# Altium footprint library LCLP.PcbLib: 75 footprints (part 3 of 5)
Each footprint in its own frame and in the unit in brackets; x right, y up, seen from the top. Pads: shape width x height; smd on the part's side, far side on the other; paste and mask are expansions set on the pad; w line width, h text height; cw(c..) or ccw(c..) is an arc to the next point about the centre after c.
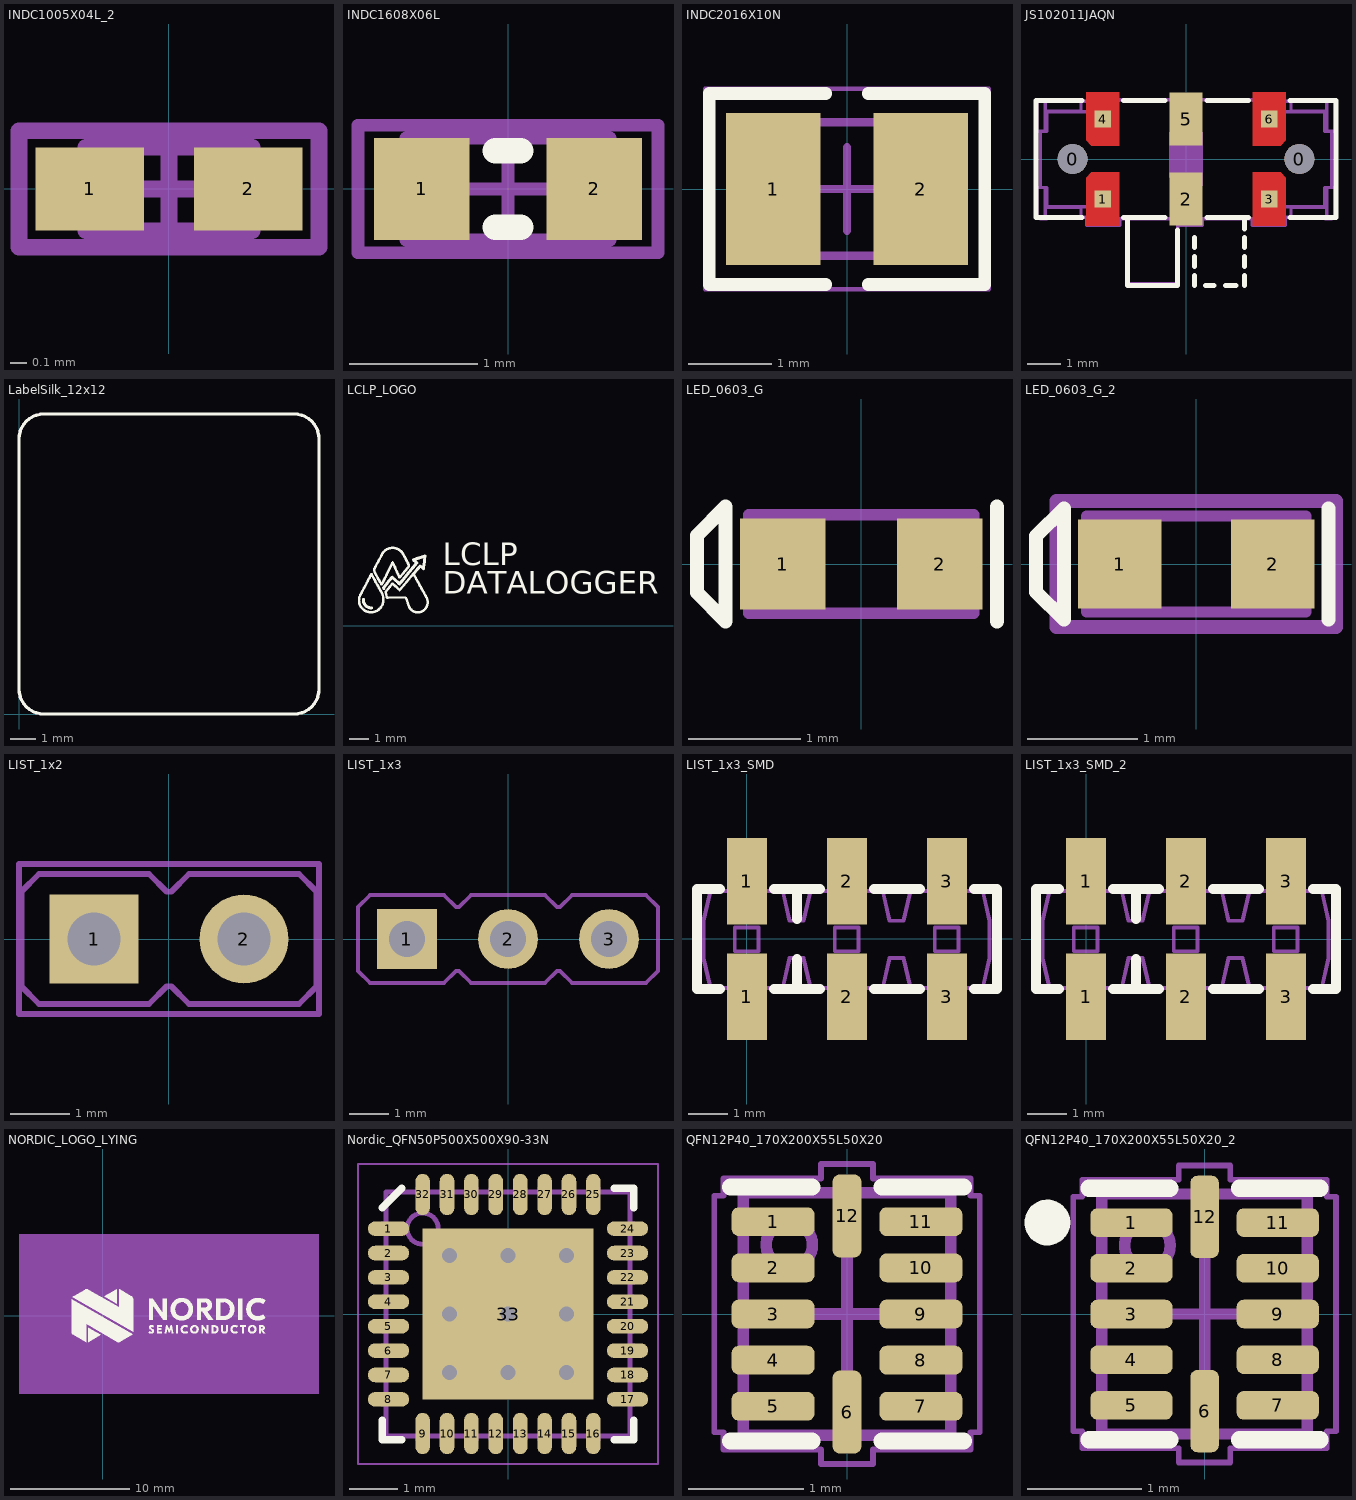
[diagram p2: the footprints below, top view; thin cyan lines are the x and y axes]

## INDC1005X04L_2 [mm]
pads (2):
  rect 0.65x0.5 smd: 1(-0.475,0) 2(0.475,0)
Mechanical 7:
  lines w0.1: -0.5,-0.25 0.5,-0.25 0.5,0.25 -0.5,0.25 -0.5,-0.25
  text ".Designator" at -1.525,-0.102 h0.31
Mechanical 15:
  lines w0.1: -0.275,0 0.275,0 ; 0,-0.275 0,0.275 ; -0.9,-0.35 0.9,-0.35 0.9,0.35 -0.9,0.35 -0.9,-0.35
3D body "INDC1005.step": height 0.5, standoff 0, extent -0.5,-0.25 0.5,0.25

## INDC1608X06L [mm] "Chip Inductor, 2-Leads, Body 1.6x0.8mm, IPC High Density"
height 0.55
pads (2):
  rect 0.75x0.8 smd: 1(-0.675,0) 2(0.675,0)
Top Overlay:
  lines w0.2: -0.1,-0.3 0.1,-0.3 ; -0.1,0.3 0.1,0.3
Mechanical 7:
  lines w0.1: -0.8,-0.4 0.8,-0.4 0.8,0.4 -0.8,0.4 -0.8,-0.4
  text ".Designator" at 1.489,0.102 h0.31
Mechanical 15:
  lines w0.1: -0.45,0 0.45,0 ; 0,-0.45 0,0.45 ; -1.175,-0.5 -1.175,0.5 1.175,0.5 1.175,-0.5 -1.175,-0.5
3D body "INDC1608.step": height 0.8, standoff 0, extent -0.8,-0.4 0.8,0.4

## INDC2016X10N [mm] "Chip Inductor, 2-Leads, Body 2.00x1.60mm, IPC Medium Density"
height 1
pads (2):
  rect 1.13x1.82 smd: 1(-0.885,0) 2(0.885,0)
Top Overlay:
  lines w0.15: -0.254,-1.143 -1.651,-1.143 -1.651,1.143 -0.254,1.143 ; 0.254,-1.143 1.651,-1.143 1.651,1.143 0.254,1.143
Mechanical 7:
  lines w0.1: -1,-0.8 1,-0.8 1,0.8 -1,0.8 -1,-0.8
  text ".Designator" at -2.032,-0.381 h0.31
Mechanical 15:
  lines w0.05: -1.7,-1.2 1.7,-1.2 1.7,1.2 -1.7,1.2 -1.7,-1.2
  lines w0.1: -0.5,0 0.5,0 ; 0,-0.5 0,0.5
3D body "INDC2016X10.step": height 1, standoff 0, extent -1,-0.8 1,0.8

## JS102011JAQN [mm] "Slide Switches - DPDT, SMD, ON-ON"
height 3.5
pads (8):
  round 0.9 hole 0.9 unplated mask+0: 0(-3.4,0) 0(3.4,0)
  rect 0.5x0.5 smd: 1(-2.5,-1.2) 3(2.5,-1.2) 4(-2.5,1.2) 6(2.5,1.2)
  rect 1x1.6 smd: 2(0,-1.2) 5(0,1.2)
Top Layer:
  region: 3,-0.562 2.838,-0.4 2,-0.4 2,-2 3,-2
  region: 3,0.562 2.838,0.4 2,0.4 2,2 3,2
  region: -3,-0.562 -2.838,-0.4 -2,-0.4 -2,-2 -3,-2
  region: -3,0.562 -2.838,0.4 -2,0.4 -2,2 -3,2
Top Overlay:
  lines w0.152: -3.126,-1.75 -4.5,-1.75 -4.5,1.75 -3.126,1.75 ; -1.874,-1.75 -0.626,-1.75 ; -1.874,1.75 -0.626,1.75 ; -1.75,-1.75 -1.75,-3.8 -0.25,-3.8 -0.25,-2.126 ; 0.25,-3.8 0.25,-3.5 ; 0.25,-3.22 0.25,-2.92 ; 0.25,-2.66 0.25,-2.36 ; 0.59,-3.8 0.84,-3.8 ; 0.626,-1.75 1.874,-1.75 ; 0.626,1.75 1.874,1.75 ; 1.19,-3.8 1.44,-3.8 ; 1.2,-3.8 1.5,-3.8 ; 1.75,-3.8 1.75,-3.5 ; 1.75,-3.22 1.75,-2.92 ; 1.75,-2.66 1.75,-2.36 ; 1.75,-2.1 1.75,-1.75 ; 3.126,-1.75 4.5,-1.75 4.5,1.75 3.126,1.75
Mechanical 7:
  region: -0.5,-0.554 -0.254,-0.8 0.5,-0.8 0.5,0.8 -0.5,0.8
  lines w0.1: -4.376,-1.747 -4.376,-1.797 -4.174,-1.797 -4.174,-1.747 ; -4.376,1.731 -4.376,1.781 -4.174,1.781 -4.174,1.731 ; -4.224,-1.747 -4.224,-0.853 ; -4.224,-1.449 -3.151,-1.449 -3.151,-1.747 ; -4.224,0.836 -4.224,1.731 ; -4.224,1.433 -3.151,1.433 -3.151,1.731 ; -2.982,-1.747 -2.982,-1.996 -1.988,-1.996 -1.988,-1.797 ; -2.783,-1.747 -2.783,-1.797 -2.772,-1.797 ; -2.783,1.731 -2.783,1.781 -2.772,1.781 ; -2.772,-1.747 -4.472,-1.747 -4.472,-0.853 -4.376,-0.853 ; -2.772,1.731 -4.472,1.731 -4.472,0.836 -4.376,0.836 ; -1.74,-1.797 -1.74,-3.735 -0.249,-3.735 -0.249,-1.797 ; -0.249,-1.996 0.496,-1.996 0.496,-1.797 ; 1.987,-1.797 1.987,-1.996 2.981,-1.996 2.981,-1.747 ; 2.77,-1.747 4.471,-1.747 4.471,-0.853 4.375,-0.853 ; 2.77,1.731 4.471,1.731 4.471,0.836 4.375,0.836 ; 2.782,-1.747 2.782,-1.797 2.77,-1.797 ; 2.782,1.731 2.782,1.781 2.77,1.781 ; 3.149,-1.747 3.149,-1.449 4.223,-1.449 ; 3.149,1.731 3.149,1.433 4.223,1.433 ; 4.173,-1.747 4.173,-1.797 4.375,-1.797 4.375,-1.747 ; 4.173,1.731 4.173,1.781 4.375,1.781 4.375,1.731 ; 4.223,-1.747 4.223,-0.853 ; 4.223,0.836 4.223,1.731 ; -4.376,-0.853 -4.168,-0.853 -4.168,-1.434 -2.772,-1.434 -2.772,-1.797 ; -4.376,-0.853 -4.376,0.836 ; -4.376,0.836 -4.168,0.836 -4.168,1.418 -2.772,1.418 -2.772,1.781 ; -2.772,-1.797 2.77,-1.797 ; -2.772,1.781 2.77,1.781 ; 2.77,-1.797 2.77,-1.434 4.166,-1.434 4.166,-0.853 4.375,-0.853 ; 2.77,1.781 2.77,1.418 4.166,1.418 4.166,0.836 4.375,0.836 ; 4.375,-0.853 4.375,0.836
  text ".Designator" at -1.062,-0.396 h0.31
3D body "CL-SB-22A-11T.stp": height 3.5, standoff 0, extent -4.25,-3.75 4.25,1.75

## LabelSilk_12x12 [mm] "PCA version label, stick-on, 12x12mm"
height 0.05
Top Overlay:
  lines w0.127: 0,1 ccw(c1,1) 1,0 11,0 ccw(c11,1) 12,1 12,11 ccw(c11,11) 11,12 1,12 ccw(c1,11) 0,11 0,1
  text ".Designator" at 2.788,5.687 h1.5
Mechanical 7:
  lines w0.1: 0,1 ccw(c1,1) 1,0 11,0 ccw(c11,1) 12,1 12,11 ccw(c11,11) 11,12 1,12 ccw(c1,11) 0,11 0,1
  text ".Designator" at 4.475,5.898 h0.31
3D body: height 0.05, standoff 0, extent 0,0 12,12

## LCLP_LOGO [mm]
Top Overlay:
  drawing of 5 lines, arcs and shapes, not listed
  text "DATALOGGER" at 7.62,1.285 h2.03
  text "LCLP" at 7.62,2.794 h2.03

## LED_0603_G [mil] "SMD Super Bright LED, GREEN"
height 23.62
pads (2):
  rect 30x32 smd: 1(-27.5,0) 2(27.5,0)
Top Overlay:
  lines w5: 47.5,-20 47.5,20 ; -57.5,-10 -57.5,10 -47.5,20 -47.5,-20 -57.5,-10
Mechanical 7:
  lines w3.94: -27.56,-17.26 -27.56,17.26 ; -23.62,-17.26 -23.62,17.26 ; 23.62,-17.26 23.62,17.26 ; 27.56,-17.26 27.56,17.26 ; -39.37,-17.26 -39.37,17.26 39.37,17.26 39.37,-17.26 -39.37,-17.26
  text ".Designator" at -60.02,-4 h12.01
3D body "User Library-led_0603_green.step": height 23.62, standoff 0, extent -31.63,-15.75 32.15,15.75

## LED_0603_G_2 [mil]
pads (2):
  rect 30x32 smd: 1(-27.5,0) 2(27.5,0)
Top Overlay:
  lines w5: 47.5,-20 47.5,20 ; -57.5,-10 -47.5,-20 -47.5,20 -57.5,10 -57.5,-10
Mechanical 7:
  rectangle: -39.37,-17.72 -22.64,17.26
  lines w3.94: -39.37,-17.26 -39.37,17.26 39.37,17.26 39.37,-17.26 -39.37,-17.26
  text ".Designator" at 67.04,4.18 h12.01
Mechanical 15:
  lines w5: -50.2,-22.64 50.2,-22.64 50.2,22.64 -50.2,22.64 -50.2,-22.64
3D body "User Library-led_0603_green.step": height 23.62, standoff 0, extent -31.63,-15.75 32.15,15.75

## LIST_1x2 [mm] "Pin List, 2.54mm through hole"
height 9.5
pads (2):
  rect 1.5x1.5 hole 0.9: 1(-1.27,0)
  round 1.5 hole 0.9: 2(1.27,0)
Mechanical 7:
  lines w0.1: -2.5,-0.8 -2.2,-1.1 -0.34,-1.1 -0.04,-0.8 0.04,-0.8 0.34,-1.1 2.2,-1.1 2.5,-0.8 2.5,0.8 2.2,1.1 0.34,1.1 0.04,0.8 -0.04,0.8 -0.34,1.1 -2.2,1.1 -2.5,0.8 -2.5,-0.8 ; -1.581,-0.311 -1.581,0.289 -0.981,0.289 -0.981,-0.311 -1.581,-0.311 ; 0.959,-0.311 0.959,0.289 1.559,0.289 1.559,-0.311 0.959,-0.311
  text ".Designator" at 0.113,-0.17 h0.31
Mechanical 15:
  lines w0.1: -2.54,-1.27 2.54,-1.27 2.54,1.27 -2.54,1.27 -2.54,-1.27
3D body "pin_header_aw140-eg-g02d.stp": height 8.2, standoff -3, extent -2.54,-1.27 2.44,1.23

## LIST_1x3 [mm] "Pin List, 2.54mm through hole"
height 9.5
pads (3):
  rect 1.5x1.5 hole 0.9: 1(-2.54,0)
  round 1.5 hole 0.9: 2(0,0) 3(2.54,0)
Mechanical 7:
  lines w0.1: -3.77,-0.8 -3.77,0.8 -3.47,1.1 -1.61,1.1 -1.31,0.8 -1.23,0.8 -0.93,1.1 0.93,1.1 1.23,0.8 1.31,0.8 1.61,1.1 3.47,1.1 3.77,0.8 3.77,-0.8 3.47,-1.1 1.61,-1.1 1.31,-0.8 1.23,-0.8 0.93,-1.1 -0.93,-1.1 -1.23,-0.8 -1.31,-0.8 -1.61,-1.1 -3.47,-1.1 -3.77,-0.8 ; -2.851,-0.311 -2.251,-0.311 -2.251,0.289 -2.851,0.289 -2.851,-0.311 ; -0.311,-0.311 -0.311,0.289 0.289,0.289 0.289,-0.311 -0.311,-0.311 ; 2.229,-0.311 2.229,0.289 2.829,0.289 2.829,-0.311 2.229,-0.311
  text ".Designator" at -2.04,-0.2 h0.31
3D body "pin_header_aw140-eg-g03d.stp": height 8.2, standoff -3, extent -3.81,-1.27 3.71,1.23

## LIST_1x3_SMD [mm] "Pin List, 2.54mm, SMD"
height 9.5
pads (6):
  rect 1.02x2.19 smd: 1(0,-1.465) 1(0,1.465) 2(2.54,-1.465) 2(2.54,1.465) 3(5.08,-1.465) 3(5.08,1.465)
Top Overlay:
  lines w0.254: -0.687,-1.27 -1.27,-1.27 -1.27,1.27 -0.687,1.27 ; 0.687,-1.27 1.853,-1.27 ; 0.687,1.27 1.853,1.27 ; 1.27,-1.27 1.27,-0.508 ; 1.27,0.508 1.27,1.27 ; 3.227,-1.27 4.393,-1.27 ; 3.227,1.27 4.393,1.27 ; 5.767,-1.27 6.35,-1.27 6.35,1.27 5.767,1.27
Mechanical 7:
  lines w0.1: -0.361,-1.241 -0.361,-1.783 ccw(c-0.011,-1.783) 0.339,-1.783 0.339,-1.241 ; 2.179,1.219 2.179,1.76 cw(c2.529,1.76) 2.879,1.76 2.879,1.219 ; 4.719,-1.241 4.719,-1.783 ccw(c5.069,-1.783) 5.419,-1.783 5.419,-1.241 ; -1.106,-0.486 -0.931,-1.241 0.909,-1.241 1.084,-0.486 1.434,-0.486 1.609,-1.241 3.449,-1.241 3.624,-0.486 3.974,-0.486 4.149,-1.241 5.989,-1.241 6.164,-0.486 6.164,0.464 5.989,1.219 4.149,1.219 3.974,0.464 3.624,0.464 3.449,1.219 1.609,1.219 1.434,0.464 1.084,0.464 0.909,1.219 -0.931,1.219 -1.106,0.464 -1.106,-0.486 ; -0.311,-0.311 -0.311,0.289 0.289,0.289 0.289,-0.311 -0.311,-0.311 ; 2.229,-0.311 2.229,0.289 2.829,0.289 2.829,-0.311 2.229,-0.311 ; 4.769,-0.311 4.769,0.289 5.369,0.289 5.369,-0.311 4.769,-0.311
  text ".Designator" at 2.794,0.102 h0.3
3D body "pin_header_a-sl254-eg-g03mp1.stp": height 9.82, standoff -0.02, extent -1.27,-2.5 6.35,2.5

## LIST_1x3_SMD_2 [mm]
pads (6):
  rect 1.02x2.19 smd: 1(0,-1.465) 1(0,1.465) 2(2.54,-1.465) 2(2.54,1.465) 3(5.08,-1.465) 3(5.08,1.465)
Top Overlay:
  lines w0.254: -0.687,-1.27 -1.27,-1.27 -1.27,1.27 -0.687,1.27 ; 0.687,-1.27 1.853,-1.27 ; 0.687,1.27 1.853,1.27 ; 1.27,-1.27 1.27,-0.508 ; 1.27,0.508 1.27,1.27 ; 3.227,-1.27 4.393,-1.27 ; 3.227,1.27 4.393,1.27 ; 5.767,-1.27 6.35,-1.27 6.35,1.27 5.767,1.27
Mechanical 7:
  lines w0.1: -0.361,-1.241 -0.361,-1.783 ccw(c-0.011,-1.783) 0.339,-1.783 0.339,-1.241 ; 2.179,1.219 2.179,1.76 cw(c2.529,1.76) 2.879,1.76 2.879,1.219 ; 4.719,-1.241 4.719,-1.783 ccw(c5.069,-1.783) 5.419,-1.783 5.419,-1.241 ; -1.106,-0.486 -1.106,0.464 -0.931,1.219 0.909,1.219 1.084,0.464 1.434,0.464 1.609,1.219 3.449,1.219 3.624,0.464 3.974,0.464 4.149,1.219 5.989,1.219 6.164,0.464 6.164,-0.486 5.989,-1.241 4.149,-1.241 3.974,-0.486 3.624,-0.486 3.449,-1.241 1.609,-1.241 1.434,-0.486 1.084,-0.486 0.909,-1.241 -0.931,-1.241 -1.106,-0.486 ; -0.311,-0.311 0.289,-0.311 0.289,0.289 -0.311,0.289 -0.311,-0.311 ; 2.229,-0.311 2.829,-0.311 2.829,0.289 2.229,0.289 2.229,-0.311 ; 4.769,-0.311 5.369,-0.311 5.369,0.289 4.769,0.289 4.769,-0.311
  text ".Designator" at 1.486,0.907 h0.31
3D body "pin_header_a-sl254-eg-g03mp1.stp": height 9.82, standoff -0.02, extent -1.27,-2.5 6.35,2.5

## NORDIC_LOGO_LYING [mm]
Top Overlay:
  drawing of 23 lines, arcs and shapes, not listed
Mechanical 15:
  pour cut-out: -7.021,6.858 18.197,6.858 18.197,-6.57 -7.021,-6.57
  pour cut-out: -4.808,4.476 15.935,4.476 15.935,-4.476 -4.808,-4.476
  lines w0.125: -4.808,-4.476 -4.808,4.476 15.935,4.476 15.935,-4.476 -4.808,-4.476

## Nordic_QFN50P500X500X90-33N [mm] "QFN32 5x5x0.85mm, 0.5mm pitch - Medium Density"
height 0.85
pads (33):
  oval 0.85x0.3 smd: 1(-2.45,1.75) 2(-2.45,1.25) 3(-2.45,0.75) 4(-2.45,0.25) 5(-2.45,-0.25) 6(-2.45,-0.75) 7(-2.45,-1.25) 8(-2.45,-1.75) 17(2.45,-1.75) 18(2.45,-1.25) 19(2.45,-0.75) 20(2.45,-0.25) 21(2.45,0.25) 22(2.45,0.75) 23(2.45,1.25) 24(2.45,1.75)
  oval 0.3x0.85 smd: 9(-1.75,-2.45) 10(-1.25,-2.45) 11(-0.75,-2.45) 12(-0.25,-2.45) 13(0.25,-2.45) 14(0.75,-2.45) 15(1.25,-2.45) 16(1.75,-2.45) 25(1.75,2.45) 26(1.25,2.45) 27(0.75,2.45) 28(0.25,2.45) 29(-0.25,2.45) 30(-0.75,2.45) 31(-1.25,2.45) 32(-1.75,2.45)
  rect 3.5x3.5 smd: 33(0,0)
via 1.2,1.2 diameter 0.5 hole 0.3
via 1.2,0 diameter 0.5 hole 0.3
via 1.2,-1.2 diameter 0.5 hole 0.3
via 0,-1.2 diameter 0.5 hole 0.3
via -1.2,-1.2 diameter 0.5 hole 0.3
via -1.2,0 diameter 0.5 hole 0.3
via -1.2,1.2 diameter 0.5 hole 0.3
via 0,1.2 diameter 0.5 hole 0.3
via 0,0 diameter 0.5 hole 0.3
Top Overlay:
  lines w0.15: -2.575,-2.175 -2.575,-2.575 -2.175,-2.575 ; -2.575,2.175 -2.175,2.575 ; 2.175,-2.575 2.575,-2.575 2.575,-2.175 ; 2.175,2.575 2.575,2.575 2.575,2.175
Mechanical 7:
  circle w0.1: c-1.75,1.75 r0.32
  lines w0.1: -2.5,-1.845 -2.571,-1.845 cw(c-2.571,-1.75) -2.571,-1.655 -2.5,-1.655 ; -2.5,-1.345 -2.571,-1.345 cw(c-2.571,-1.25) -2.571,-1.155 -2.5,-1.155 ; -2.5,-0.845 -2.571,-0.845 cw(c-2.571,-0.75) -2.571,-0.655 -2.5,-0.655 ; -2.5,-0.345 -2.571,-0.345 cw(c-2.571,-0.25) -2.571,-0.155 -2.5,-0.155 ; -2.5,0.155 -2.571,0.155 cw(c-2.571,0.25) -2.571,0.345 -2.5,0.345 ; -2.5,0.655 -2.571,0.655 cw(c-2.571,0.75) -2.571,0.845 -2.5,0.845 ; -2.5,1.155 -2.571,1.155 cw(c-2.571,1.25) -2.571,1.345 -2.5,1.345 ; -2.5,1.655 -2.571,1.655 cw(c-2.571,1.75) -2.571,1.845 -2.5,1.845 ; -1.845,-2.5 -1.845,-2.571 ccw(c-1.75,-2.571) -1.655,-2.571 -1.655,-2.5 ; -1.845,2.5 -1.845,2.571 cw(c-1.75,2.571) -1.655,2.571 -1.655,2.5 ; -1.345,-2.5 -1.345,-2.571 ccw(c-1.25,-2.571) -1.155,-2.571 -1.155,-2.5 ; -1.345,2.5 -1.345,2.571 cw(c-1.25,2.571) -1.155,2.571 -1.155,2.5 ; -0.845,-2.5 -0.845,-2.571 ccw(c-0.75,-2.571) -0.655,-2.571 -0.655,-2.5 ; -0.845,2.5 -0.845,2.571 cw(c-0.75,2.571) -0.655,2.571 -0.655,2.5 ; -0.345,-2.5 -0.345,-2.571 ccw(c-0.25,-2.571) -0.155,-2.571 -0.155,-2.5 ; -0.345,2.5 -0.345,2.571 cw(c-0.25,2.571) -0.155,2.571 -0.155,2.5 ; 0.155,-2.5 0.155,-2.571 ccw(c0.25,-2.571) 0.345,-2.571 0.345,-2.5 ; 0.155,2.5 0.155,2.571 cw(c0.25,2.571) 0.345,2.571 0.345,2.5 ; 0.655,-2.5 0.655,-2.571 ccw(c0.75,-2.571) 0.845,-2.571 0.845,-2.5 ; 0.655,2.5 0.655,2.571 cw(c0.75,2.571) 0.845,2.571 0.845,2.5 ; 1.155,-2.5 1.155,-2.571 ccw(c1.25,-2.571) 1.345,-2.571 1.345,-2.5 ; 1.155,2.5 1.155,2.571 cw(c1.25,2.571) 1.345,2.571 1.345,2.5 ; 1.655,-2.5 1.655,-2.571 ccw(c1.75,-2.571) 1.845,-2.571 1.845,-2.5 ; 1.655,2.5 1.655,2.571 cw(c1.75,2.571) 1.845,2.571 1.845,2.5 ; 2.5,-1.845 2.571,-1.845 ccw(c2.571,-1.75) 2.571,-1.655 2.5,-1.655 ; 2.5,-1.345 2.571,-1.345 ccw(c2.571,-1.25) 2.571,-1.155 2.5,-1.155 ; 2.5,-0.845 2.571,-0.845 ccw(c2.571,-0.75) 2.571,-0.655 2.5,-0.655 ; 2.5,-0.345 2.571,-0.345 ccw(c2.571,-0.25) 2.571,-0.155 2.5,-0.155 ; 2.5,0.155 2.571,0.155 ccw(c2.571,0.25) 2.571,0.345 2.5,0.345 ; 2.5,0.655 2.571,0.655 ccw(c2.571,0.75) 2.571,0.845 2.5,0.845 ; 2.5,1.155 2.571,1.155 ccw(c2.571,1.25) 2.571,1.345 2.5,1.345 ; 2.5,1.655 2.571,1.655 ccw(c2.571,1.75) 2.571,1.845 2.5,1.845 ; -2.5,-2.5 2.5,-2.5 2.5,2.5 -2.5,2.5 -2.5,-2.5
  text ".Designator" at 0.542,0.246 h0.31
Mechanical 15:
  lines w0.05: -3.075,-3.075 -3.075,3.075 3.075,3.075 3.075,-3.075 -3.075,-3.075
  lines w0.1: -0.5,0 0.5,0 ; 0,-0.5 0,0.5
3D body "QFN50P500X500X90_HS-33N.step": height 0.9, standoff 0, extent -2.501,-2.501 2.501,2.501

## QFN12P40_170X200X55L50X20 [mm] "QFN, 12-Leads, Body 2,1x1,8mm (max), Pitch 0,40mm, IPC Low Density"
height 0.5
pads (12):
  rrect50% 0.72x0.25 smd: 1(-0.64,0.8) 2(-0.64,0.4) 3(-0.64,0) 4(-0.64,-0.4) 5(-0.64,-0.8) 7(0.64,-0.8) 8(0.64,-0.4) 9(0.64,0) 10(0.64,0.4) 11(0.64,0.8)
  rrect50% 0.25x0.72 smd: 6(0,-0.85) 12(0,0.85)
Top Overlay:
  lines w0.15: -1.01,-1.1 -0.305,-1.1 ; -1.01,1.1 -0.305,1.1 ; 0.305,-1.1 1.01,-1.1 ; 0.305,1.1 1.01,1.1
Mechanical 7:
  circle w0.1: c-0.5,0.6 r0.2
  lines w0.1: -0.9,-1.05 0.9,-1.05 0.9,1.05 -0.9,1.05 -0.9,-1.05
  text ".Designator" at -0.6,-0.3 h0.38
Mechanical 15:
  lines w0.05: -1.15,-1.025 -1.15,1.025 -1.07,1.025 -1.07,1.175 -0.225,1.175 -0.225,1.3 0.225,1.3 0.225,1.175 1.07,1.175 1.07,1.025 1.15,1.025 1.15,-1.025 1.07,-1.025 1.07,-1.175 0.225,-1.175 0.225,-1.3 -0.225,-1.3 -0.225,-1.175 -1.07,-1.175 -1.07,-1.025 -1.15,-1.025
  lines w0.1: -0.5,0 0.5,0 ; 0,-0.5 0,0.5
3D body "TXU0304RUTR--3DModel-STEP-56544.STEP": height 0.55, standoff 0, extent -0.85,-1 0.85,1

## QFN12P40_170X200X55L50X20_2 [mm]
pads (12):
  rrect50% 0.72x0.25 smd: 1(-0.64,0.8) 2(-0.64,0.4) 3(-0.64,0) 4(-0.64,-0.4) 5(-0.64,-0.8) 7(0.64,-0.8) 8(0.64,-0.4) 9(0.64,0) 10(0.64,0.4) 11(0.64,0.8)
  rrect50% 0.25x0.72 smd: 6(0,-0.85) 12(0,0.85)
Top Overlay:
  circle w0.2: c-1.375,0.8 r0.1
  lines w0.15: -1.01,-1.1 -0.305,-1.1 ; -1.01,1.1 -0.305,1.1 ; 0.305,-1.1 1.01,-1.1 ; 0.305,1.1 1.01,1.1
Mechanical 7:
  circle w0.1: c-0.5,0.6 r0.2
  lines w0.1: -0.9,-1.05 0.9,-1.05 0.9,1.05 -0.9,1.05 -0.9,-1.05
  text ".Designator" at 0.225,-0.25 h0.31
Mechanical 15:
  lines w0.05: -1.15,-1.025 -1.15,1.025 -1.07,1.025 -1.07,1.175 -0.225,1.175 -0.225,1.3 0.225,1.3 0.225,1.175 1.07,1.175 1.07,1.025 1.15,1.025 1.15,-1.025 1.07,-1.025 1.07,-1.175 0.225,-1.175 0.225,-1.3 -0.225,-1.3 -0.225,-1.175 -1.07,-1.175 -1.07,-1.025 -1.15,-1.025
  lines w0.1: -0.5,0 0.5,0 ; 0,-0.5 0,0.5
3D body "TXU0304RUTR--3DModel-STEP-56544.STEP": height 0.55, standoff 0, extent -0.85,-1 0.85,1